# Altium footprint library 金属膜电容.PcbLib: 38 footprints (part 2 of 3)
Each footprint in its own frame and in the unit in brackets; x right, y up, seen from the top. Pads: shape width x height; smd on the part's side, far side on the other; paste and mask are expansions set on the pad; w line width, h text height; cw(c..) or ccw(c..) is an arc to the next point about the centre after c.
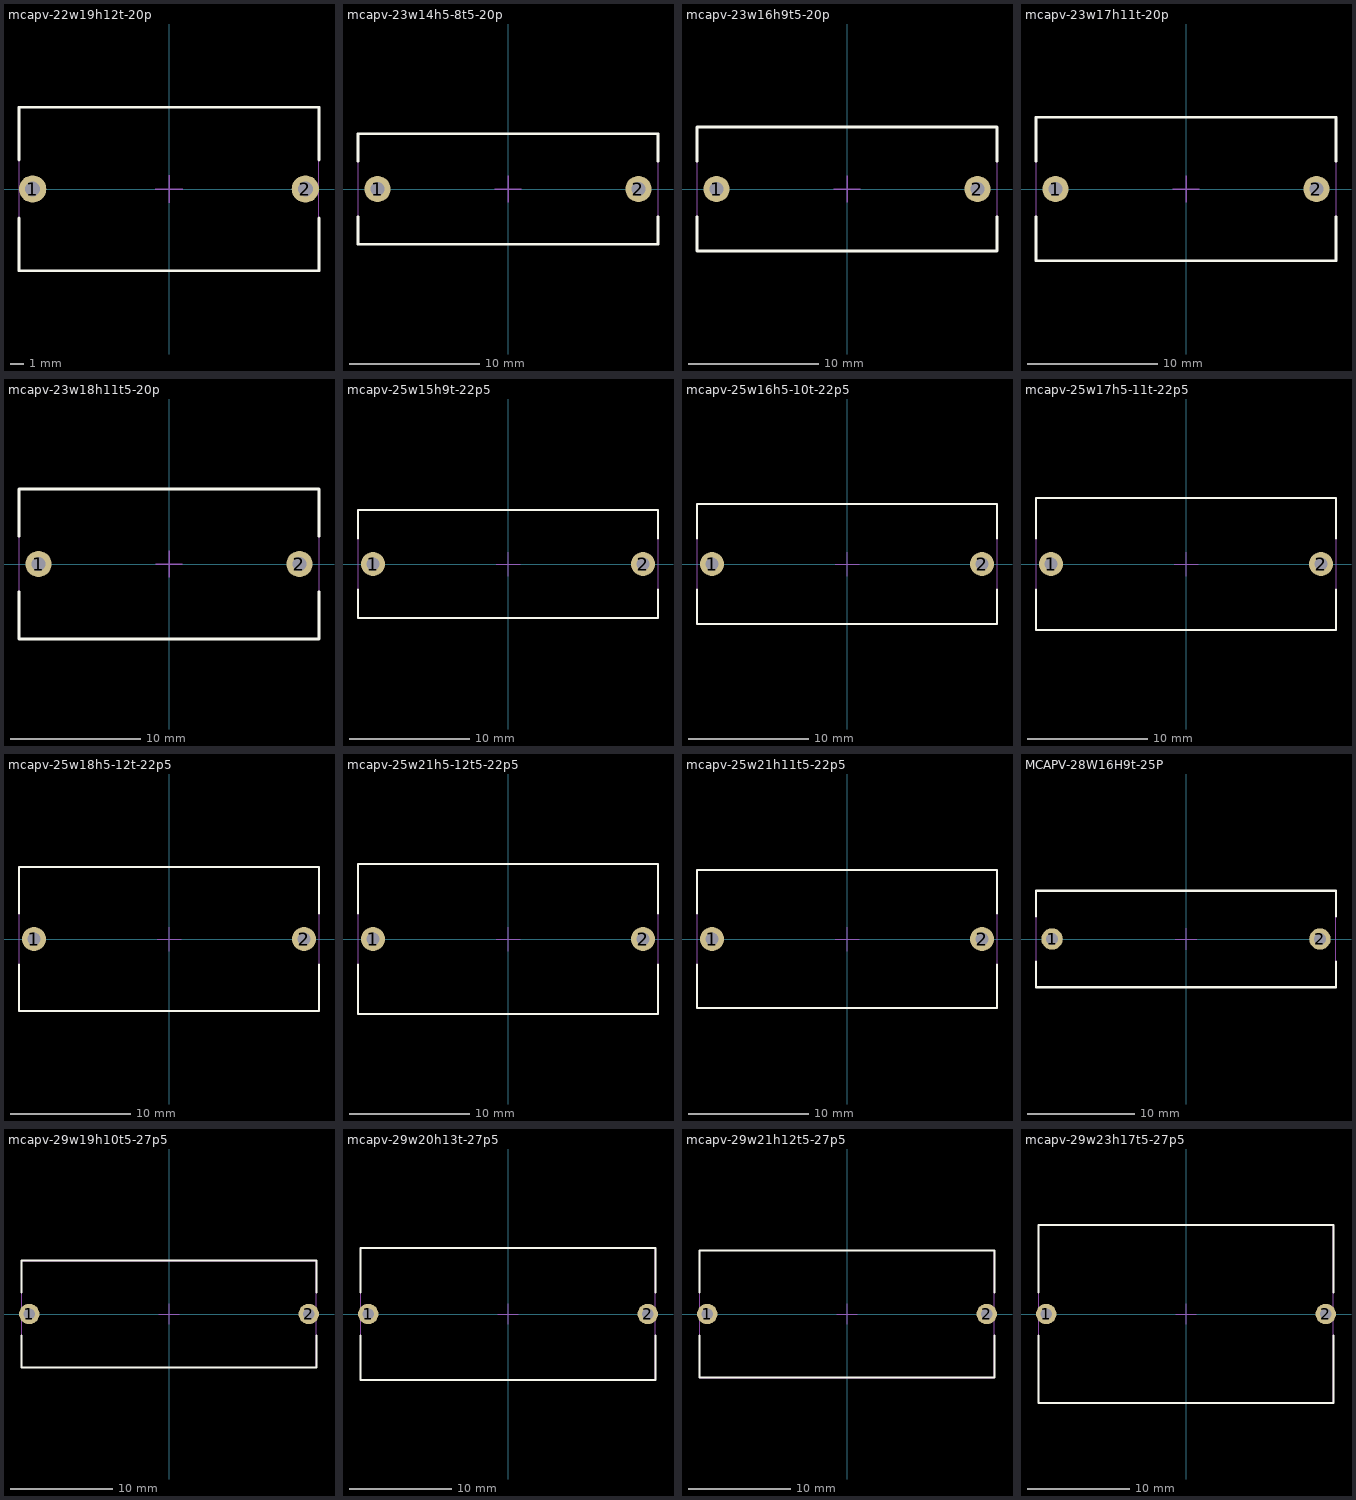
[diagram p1: the footprints below, top view; thin cyan lines are the x and y axes]

## mcapv-22w19h12t-20p [mm] "金属化薄膜电容"
pads (2):
  round 2 hole 1.1: 1(-10,0) 2(10,0)
Top Overlay:
  lines w0.2: -11,-2.125 -11,-6 11,-6 11,-2.125 ; -11,2.125 -11,6.001 11,6.001 11,2.125
Mechanical 13:
  lines w0.05: -11,-6 -11,6.001 11,6.001 11,-6 -11,-6
Mechanical 15:
  lines w0.1: -1,0 1,0 ; 0,-1 0,1
3D body: height 20, standoff -4, extent -11,-6 11,6.001

## mcapv-23w14h5-8t5-20p [mm] "金属化薄膜电容"
height 8
pads (2):
  round 2 hole 1.1: 1(-10,0) 2(10,0)
Top Overlay:
  lines w0.2: -11.5,-2.125 -11.5,-4.25 11.5,-4.25 11.5,-2.125 ; -11.5,2.125 -11.5,4.251 11.5,4.251 11.5,2.125
Mechanical 13:
  lines w0.05: -11.5,-4.25 -11.5,4.251 11.5,4.251 11.5,-4.25 -11.5,-4.25
Mechanical 15:
  lines w0.1: -1,0 1,0 ; 0,-1 0,1
3D body: height 15.75, standoff -3.75, extent -11.5,-4.25 11.5,4.251

## mcapv-23w16h9t5-20p [mm] "金属化薄膜电容"
height 9
pads (2):
  round 2 hole 1.1: 1(-10,0) 2(10,0)
Top Overlay:
  lines w0.2: -11.5,-2.125 -11.5,-4.75 11.5,-4.75 11.5,-2.125 ; -11.5,2.125 -11.5,4.751 11.5,4.751 11.5,2.125
Mechanical 13:
  lines w0.05: -11.5,-4.75 -11.5,4.751 11.5,4.751 11.5,-4.75 -11.5,-4.75
Mechanical 15:
  lines w0.1: -1,0 1,0 ; 0,-1 0,1
3D body: height 17, standoff -4, extent -11.5,-4.75 11.5,4.751

## mcapv-23w17h11t-20p [mm] "金属化薄膜电容"
pads (2):
  round 2 hole 1.1: 1(-10,0) 2(10,0)
Top Overlay:
  lines w0.2: -11.5,-2.125 -11.5,-5.5 11.5,-5.5 11.5,-2.125 ; -11.5,2.125 -11.5,5.501 11.5,5.501 11.5,2.125
Mechanical 13:
  lines w0.05: -11.5,-5.5 11.5,-5.5 11.5,5.501 -11.5,5.501 -11.5,-5.5
Mechanical 15:
  lines w0.1: -1,0 1,0 ; 0,-1 0,1
3D body: height 18, standoff -4, extent -11.5,-5.5 11.5,5.501

## mcapv-23w18h11t5-20p [mm] "金属化薄膜电容"
height 10
pads (2):
  round 2 hole 1.1: 1(-10,0) 2(10,0)
Top Overlay:
  lines w0.2: -11.5,-2.125 -11.5,-5.75 11.5,-5.75 11.5,-2.125 ; -11.5,2.125 -11.5,5.751 11.5,5.751 11.5,2.125
Mechanical 13:
  lines w0.05: -11.5,-5.75 11.5,-5.75 11.5,5.751 -11.5,5.751 -11.5,-5.75
Mechanical 15:
  lines w0.1: -1,0 1,0 ; 0,-1 0,1
3D body: height 19, standoff -4, extent -11.5,-5.75 11.5,5.751

## mcapv-25w15h9t-22p5 [mm] "金属化薄膜电容"
height 8
pads (2):
  round 2 hole 1.1: 1(-11.25,0) 2(11.25,0)
Top Overlay:
  lines w0.2: -12.5,-2.125 -12.5,-4.5 12.5,-4.5 12.5,-2.125 ; -12.5,2.125 -12.5,4.501 12.5,4.501 12.5,2.125
Mechanical 13:
  lines w0.05: -12.5,-4.5 -12.5,4.501 12.5,4.501 12.5,-4.5 -12.5,-4.5
Mechanical 15:
  lines w0.1: -1,0 1,0 ; 0,-1 0,1
3D body: height 16, standoff -4, extent -12.5,-4.5 12.5,4.501

## mcapv-25w16h5-10t-22p5 [mm] "金属化薄膜电容"
height 9.5
pads (2):
  round 2 hole 1.1: 1(-11.25,0) 2(11.25,0)
Top Overlay:
  lines w0.2: -12.5,-2.125 -12.5,-5 12.5,-5 12.5,-2.125 ; -12.5,2.125 -12.5,5.001 12.5,5.001 12.5,2.125
Mechanical 13:
  lines w0.05: -12.5,-5 -12.5,5.001 12.5,5.001 12.5,-5 -12.5,-5
Mechanical 15:
  lines w0.1: -1,0 1,0 ; 0,-1 0,1
3D body: height 17.75, standoff -3.75, extent -12.5,-5 12.5,5.001

## mcapv-25w17h5-11t-22p5 [mm] "金属化薄膜电容"
height 9.5
pads (2):
  round 2 hole 1.1: 1(-11.25,0) 2(11.25,0)
Top Overlay:
  lines w0.2: -12.5,-2.125 -12.5,-5.5 12.5,-5.5 12.5,-2.125 ; -12.5,2.125 -12.5,5.501 12.5,5.501 12.5,2.125
Mechanical 13:
  lines w0.05: -12.5,-5.5 12.5,-5.5 12.5,5.501 -12.5,5.501 -12.5,-5.5
Mechanical 15:
  lines w0.1: -1,0 1,0 ; 0,-1 0,1
3D body: height 18.75, standoff -3.75, extent -12.5,-5.5 12.5,5.501

## mcapv-25w18h5-12t-22p5 [mm] "金属化薄膜电容"
height 10
pads (2):
  round 2 hole 1.1: 1(-11.25,0) 2(11.25,0)
Top Overlay:
  lines w0.2: -12.5,-2.125 -12.5,-6 12.5,-6 12.5,-2.125 ; -12.5,2.125 -12.5,6.001 12.5,6.001 12.5,2.125
Mechanical 13:
  lines w0.05: -12.5,-6 12.5,-6 12.5,6.001 -12.5,6.001 -12.5,-6
Mechanical 15:
  lines w0.1: -1,0 1,0 ; 0,-1 0,1
3D body: height 19.75, standoff -3.75, extent -12.5,-6 12.5,6.001

## mcapv-25w21h5-12t5-22p5 [mm] "金属化薄膜电容"
height 12
pads (2):
  round 2 hole 1.1: 1(-11.25,0) 2(11.25,0)
Top Overlay:
  lines w0.2: -12.5,-2.125 -12.5,-6.25 12.5,-6.25 12.5,-2.125 ; -12.5,2.125 -12.5,6.251 12.5,6.251 12.5,2.125
Mechanical 13:
  lines w0.05: -12.5,-6.25 12.5,-6.25 12.5,6.251 -12.5,6.251 -12.5,-6.25
Mechanical 15:
  lines w0.1: -1,0 1,0 ; 0,-1 0,1
3D body: height 22.75, standoff -3.75, extent -12.5,-6.25 12.5,6.251

## mcapv-25w21h11t5-22p5 [mm] "金属化薄膜电容"
height 12.5
pads (2):
  round 2 hole 1.1: 1(-11.25,0) 2(11.25,0)
Top Overlay:
  lines w0.2: -12.5,-2.125 -12.5,-5.75 12.5,-5.75 12.5,-2.125 ; -12.5,2.125 -12.5,5.751 12.5,5.751 12.5,2.125
Mechanical 13:
  lines w0.05: -12.5,-5.75 12.5,-5.75 12.5,5.751 -12.5,5.751 -12.5,-5.75
Mechanical 15:
  lines w0.1: -1,0 1,0 ; 0,-1 0,1
3D body: height 22, standoff -4, extent -12.5,-5.75 12.5,5.751

## MCAPV-28W16H9t-25P [mm] "金属膜电容"
height 16
pads (2):
  round 2 hole 1.1: 1(-12.5,0) 2(12.5,0)
Top Overlay:
  lines w0.2: -14,-2.125 -14,-4.5 14,-4.5 14,-2.125 ; -14,2.125 -14,4.501 14,4.501 14,2.125
Mechanical 13:
  lines w0.05: -14,-4.5 14,-4.5 14,4.501 -14,4.501 -14,-4.5
Mechanical 15:
  lines w0.1: -1,0 1,0 ; 0,-1 0,1
3D body: height 17, standoff -4, extent -14,-4.5 14,4.501

## mcapv-29w19h10t5-27p5 [mm] "金属化薄膜电容"
height 10.5
pads (2):
  round 2 hole 1.1: 1(-13.75,0) 2(13.75,0)
Top Overlay:
  lines w0.2: -14.5,-2.125 -14.5,-5.25 14.5,-5.25 14.5,-2.125 ; -14.5,2.125 -14.5,5.251 14.5,5.251 14.5,2.125
Mechanical 13:
  lines w0.05: -14.5,-5.25 -14.5,5.251 14.5,5.251 14.5,-5.25 -14.5,-5.25
Mechanical 15:
  lines w0.1: -1,0 1,0 ; 0,-1 0,1
3D body: height 20, standoff -4, extent -14.5,-5.25 14.5,5.251

## mcapv-29w20h13t-27p5 [mm] "金属化薄膜电容"
height 11
pads (2):
  round 2 hole 1.1: 1(-13.75,0) 2(13.75,0)
Top Overlay:
  lines w0.2: -14.5,-2.125 -14.5,-6.5 14.5,-6.5 14.5,-2.125 ; -14.5,2.125 -14.5,6.501 14.5,6.501 14.5,2.125
Mechanical 13:
  lines w0.05: -14.5,-6.5 14.5,-6.5 14.5,6.501 -14.5,6.501 -14.5,-6.5
Mechanical 15:
  lines w0.1: -1,0 1,0 ; 0,-1 0,1
3D body: height 21, standoff -4, extent -14.5,-6.5 14.5,6.501

## mcapv-29w21h12t5-27p5 [mm] "金属化薄膜电容"
height 11.5
pads (2):
  round 2 hole 1.1: 1(-13.75,0) 2(13.75,0)
Top Overlay:
  lines w0.2: -14.5,-2.125 -14.5,-6.25 14.5,-6.25 14.5,-2.125 ; -14.5,2.125 -14.5,6.251 14.5,6.251 14.5,2.125
Mechanical 13:
  lines w0.05: -14.5,-6.25 -14.5,6.251 14.5,6.251 14.5,-6.25 -14.5,-6.25
Mechanical 15:
  lines w0.1: -1,0 1,0 ; 0,-1 0,1
3D body: height 22, standoff -4, extent -14.5,-6.25 14.5,6.251

## mcapv-29w23h17t5-27p5 [mm] "金属化薄膜电容"
height 12.5
pads (2):
  round 2 hole 1.1: 1(-13.75,0) 2(13.75,0)
Top Overlay:
  lines w0.2: -14.5,-2.125 -14.5,-8.75 14.5,-8.75 14.5,-2.125 ; -14.5,2.125 -14.5,8.751 14.5,8.751 14.5,2.125
Mechanical 13:
  lines w0.05: -14.5,-8.75 -14.5,8.751 14.5,8.751 14.5,-8.75 -14.5,-8.75
Mechanical 15:
  lines w0.1: -1,0 1,0 ; 0,-1 0,1
3D body: height 24, standoff -4, extent -14.5,-8.75 14.5,8.751